# Altium footprint library Connector_PinHeader_2.54mm.PcbLib: 278 footprints (part 13 of 18) (continued)
## PinHeader_2x15_P2.54mm_Horizontal [mm] (continued)
F.CrtYd:
  lines w0.05: -1.8,-37.35 -1.8,1.8 13.1,1.8 13.1,-37.35 -1.8,-37.35
F.Fab:
  lines w0.1: 4.04,-35.88 -0.32,-35.88 -0.32,-35.24 4.04,-35.24 ; 4.04,-33.34 -0.32,-33.34 -0.32,-32.7 4.04,-32.7 ; 4.04,-30.8 -0.32,-30.8 -0.32,-30.16 4.04,-30.16 ; 4.04,-28.26 -0.32,-28.26 -0.32,-27.62 4.04,-27.62 ; 4.04,-25.72 -0.32,-25.72 -0.32,-25.08 4.04,-25.08 ; 4.04,-23.18 -0.32,-23.18 -0.32,-22.54 4.04,-22.54 ; 4.04,-20.64 -0.32,-20.64 -0.32,-20 4.04,-20 ; 4.04,-18.1 -0.32,-18.1 -0.32,-17.46 4.04,-17.46 ; 4.04,-15.56 -0.32,-15.56 -0.32,-14.92 4.04,-14.92 ; 4.04,-13.02 -0.32,-13.02 -0.32,-12.38 4.04,-12.38 ; 4.04,-10.48 -0.32,-10.48 -0.32,-9.84 4.04,-9.84 ; 4.04,-7.94 -0.32,-7.94 -0.32,-7.3 4.04,-7.3 ; 4.04,-5.4 -0.32,-5.4 -0.32,-4.76 4.04,-4.76 ; 4.04,-2.86 -0.32,-2.86 -0.32,-2.22 4.04,-2.22 ; 4.04,-0.32 -0.32,-0.32 -0.32,0.32 4.04,0.32 ; 6.58,-35.88 12.58,-35.88 12.58,-35.24 6.58,-35.24 ; 6.58,-33.34 12.58,-33.34 12.58,-32.7 6.58,-32.7 ; 6.58,-30.8 12.58,-30.8 12.58,-30.16 6.58,-30.16 ; 6.58,-28.26 12.58,-28.26 12.58,-27.62 6.58,-27.62 ; 6.58,-25.72 12.58,-25.72 12.58,-25.08 6.58,-25.08 ; 6.58,-23.18 12.58,-23.18 12.58,-22.54 6.58,-22.54 ; 6.58,-20.64 12.58,-20.64 12.58,-20 6.58,-20 ; 6.58,-18.1 12.58,-18.1 12.58,-17.46 6.58,-17.46 ; 6.58,-15.56 12.58,-15.56 12.58,-14.92 6.58,-14.92 ; 6.58,-13.02 12.58,-13.02 12.58,-12.38 6.58,-12.38 ; 6.58,-10.48 12.58,-10.48 12.58,-9.84 6.58,-9.84 ; 6.58,-7.94 12.58,-7.94 12.58,-7.3 6.58,-7.3 ; 6.58,-5.4 12.58,-5.4 12.58,-4.76 6.58,-4.76 ; 6.58,-2.86 12.58,-2.86 12.58,-2.22 6.58,-2.22 ; 6.58,-0.32 12.58,-0.32 12.58,0.32 6.58,0.32 ; 4.04,-36.83 4.04,0.635 4.675,1.27 6.58,1.27 6.58,-36.83 4.04,-36.83
  text "'.Designator'" at 6.15,-21.827 h1

## PinHeader_2x15_P2.54mm_Vertical [mm]
pads (30):
  rect 1.7x1.7 hole 1: 1(0,0)
  rrect100% 1.7x1.7 hole 1: 2(2.54,0) 3(0,-2.54) 4(2.54,-2.54) 5(0,-5.08) 6(2.54,-5.08) 7(0,-7.62) 8(2.54,-7.62) 9(0,-10.16) 10(2.54,-10.16) 11(0,-12.7) 12(2.54,-12.7) 13(0,-15.24) 14(2.54,-15.24) 15(0,-17.78) 16(2.54,-17.78) 17(0,-20.32) 18(2.54,-20.32) 19(0,-22.86) 20(2.54,-22.86) 21(0,-25.4) 22(2.54,-25.4) 23(0,-27.94) 24(2.54,-27.94) 25(0,-30.48) 26(2.54,-30.48) 27(0,-33.02) 28(2.54,-33.02) 29(0,-35.56) 30(2.54,-35.56)
F.SilkS:
  lines w0.12: -1.33,0 -1.33,1.33 0,1.33 ; -1.33,-36.89 3.87,-36.89 3.87,1.33 1.27,1.33 1.27,-1.27 -1.33,-1.27 -1.33,-36.89
F.CrtYd:
  lines w0.05: -1.8,-37.35 4.35,-37.35 4.35,1.8 -1.8,1.8 -1.8,-37.35
F.Fab:
  lines w0.1: -1.27,-36.83 -1.27,0 0,1.27 3.81,1.27 3.81,-36.83 -1.27,-36.83
  text "'.Designator'" at 2.11,-21.827 h1

## PinHeader_2x15_P2.54mm_Vertical_SMD [mm]
pads (30):
  rect 3.15x1 smd: 1(-2.525,17.78) 2(2.525,17.78) 3(-2.525,15.24) 4(2.525,15.24) 5(-2.525,12.7) 6(2.525,12.7) 7(-2.525,10.16) 8(2.525,10.16) 9(-2.525,7.62) 10(2.525,7.62) 11(-2.525,5.08) 12(2.525,5.08) 13(-2.525,2.54) 14(2.525,2.54) 15(-2.525,0) 16(2.525,0) 17(-2.525,-2.54) 18(2.525,-2.54) 19(-2.525,-5.08) 20(2.525,-5.08) 21(-2.525,-7.62) 22(2.525,-7.62) 23(-2.525,-10.16) 24(2.525,-10.16) 25(-2.525,-12.7) 26(2.525,-12.7) 27(-2.525,-15.24) 28(2.525,-15.24) 29(-2.525,-17.78) 30(2.525,-17.78)
F.SilkS:
  lines w0.12: -4.04,18.54 -2.6,18.54 -2.6,19.11 2.6,19.11 2.6,18.54 ; -2.6,-18.54 -2.6,-19.11 2.6,-19.11 2.6,-18.54 ; -2.6,-17.02 -2.6,-16 ; -2.6,-14.48 -2.6,-13.46 ; -2.6,-11.94 -2.6,-10.92 ; -2.6,-9.4 -2.6,-8.38 ; -2.6,-6.86 -2.6,-5.84 ; -2.6,-4.32 -2.6,-3.3 ; -2.6,-1.78 -2.6,-0.76 ; -2.6,0.76 -2.6,1.78 ; -2.6,3.3 -2.6,4.32 ; -2.6,5.84 -2.6,6.86 ; -2.6,8.38 -2.6,9.4 ; -2.6,10.92 -2.6,11.94 ; -2.6,13.46 -2.6,14.48 ; -2.6,16 -2.6,17.02 ; 2.6,-17.02 2.6,-16 ; 2.6,-14.48 2.6,-13.46 ; 2.6,-11.94 2.6,-10.92 ; 2.6,-9.4 2.6,-8.38 ; 2.6,-6.86 2.6,-5.84 ; 2.6,-4.32 2.6,-3.3 ; 2.6,-1.78 2.6,-0.76 ; 2.6,0.76 2.6,1.78 ; 2.6,3.3 2.6,4.32 ; 2.6,5.84 2.6,6.86 ; 2.6,8.38 2.6,9.4 ; 2.6,10.92 2.6,11.94 ; 2.6,13.46 2.6,14.48 ; 2.6,16 2.6,17.02
F.CrtYd:
  lines w0.05: -5.9,-19.6 5.9,-19.6 5.9,19.6 -5.9,19.6 -5.9,-19.6
F.Fab:
  lines w0.1: -2.54,-18.1 -3.6,-18.1 -3.6,-17.46 -2.54,-17.46 ; -2.54,-15.56 -3.6,-15.56 -3.6,-14.92 -2.54,-14.92 ; -2.54,-13.02 -3.6,-13.02 -3.6,-12.38 -2.54,-12.38 ; -2.54,-10.48 -3.6,-10.48 -3.6,-9.84 -2.54,-9.84 ; -2.54,-7.94 -3.6,-7.94 -3.6,-7.3 -2.54,-7.3 ; -2.54,-5.4 -3.6,-5.4 -3.6,-4.76 -2.54,-4.76 ; -2.54,-2.86 -3.6,-2.86 -3.6,-2.22 -2.54,-2.22 ; -2.54,-0.32 -3.6,-0.32 -3.6,0.32 -2.54,0.32 ; -2.54,2.22 -3.6,2.22 -3.6,2.86 -2.54,2.86 ; -2.54,4.76 -3.6,4.76 -3.6,5.4 -2.54,5.4 ; -2.54,7.3 -3.6,7.3 -3.6,7.94 -2.54,7.94 ; -2.54,9.84 -3.6,9.84 -3.6,10.48 -2.54,10.48 ; -2.54,12.38 -3.6,12.38 -3.6,13.02 -2.54,13.02 ; -2.54,14.92 -3.6,14.92 -3.6,15.56 -2.54,15.56 ; -2.54,17.46 -3.6,17.46 -3.6,18.1 -2.54,18.1 ; 2.54,-18.1 3.6,-18.1 3.6,-17.46 2.54,-17.46 ; 2.54,-15.56 3.6,-15.56 3.6,-14.92 2.54,-14.92 ; 2.54,-13.02 3.6,-13.02 3.6,-12.38 2.54,-12.38 ; 2.54,-10.48 3.6,-10.48 3.6,-9.84 2.54,-9.84 ; 2.54,-7.94 3.6,-7.94 3.6,-7.3 2.54,-7.3 ; 2.54,-5.4 3.6,-5.4 3.6,-4.76 2.54,-4.76 ; 2.54,-2.86 3.6,-2.86 3.6,-2.22 2.54,-2.22 ; 2.54,-0.32 3.6,-0.32 3.6,0.32 2.54,0.32 ; 2.54,2.22 3.6,2.22 3.6,2.86 2.54,2.86 ; 2.54,4.76 3.6,4.76 3.6,5.4 2.54,5.4 ; 2.54,7.3 3.6,7.3 3.6,7.94 2.54,7.94 ; 2.54,9.84 3.6,9.84 3.6,10.48 2.54,10.48 ; 2.54,12.38 3.6,12.38 3.6,13.02 2.54,13.02 ; 2.54,14.92 3.6,14.92 3.6,15.56 2.54,15.56 ; 2.54,17.46 3.6,17.46 3.6,18.1 2.54,18.1 ; -2.54,18.1 -2.54,-19.05 2.54,-19.05 2.54,19.05 -1.59,19.05 -2.54,18.1
  text "'.Designator'" at 0.84,-4.047 h1

## PinHeader_2x16_P2.54mm_Horizontal [mm]
pads (32):
  rect 1.7x1.7 hole 1: 1(0,0)
  rrect100% 1.7x1.7 hole 1: 2(2.54,0) 3(0,-2.54) 4(2.54,-2.54) 5(0,-5.08) 6(2.54,-5.08) 7(0,-7.62) 8(2.54,-7.62) 9(0,-10.16) 10(2.54,-10.16) 11(0,-12.7) 12(2.54,-12.7) 13(0,-15.24) 14(2.54,-15.24) 15(0,-17.78) 16(2.54,-17.78) 17(0,-20.32) 18(2.54,-20.32) 19(0,-22.86) 20(2.54,-22.86) 21(0,-25.4) 22(2.54,-25.4) 23(0,-27.94) 24(2.54,-27.94) 25(0,-30.48) 26(2.54,-30.48) 27(0,-33.02) 28(2.54,-33.02) 29(0,-35.56) 30(2.54,-35.56) 31(0,-38.1) 32(2.54,-38.1)
F.SilkS:
  lines w0.12: -1.27,0 -1.27,1.27 0,1.27 ; 1.043,-38.48 1.497,-38.48 ; 1.043,-37.72 1.497,-37.72 ; 1.043,-35.94 1.497,-35.94 ; 1.043,-35.18 1.497,-35.18 ; 1.043,-33.4 1.497,-33.4 ; 1.043,-32.64 1.497,-32.64 ; 1.043,-30.86 1.497,-30.86 ; 1.043,-30.1 1.497,-30.1 ; 1.043,-28.32 1.497,-28.32 ; 1.043,-27.56 1.497,-27.56 ; 1.043,-25.78 1.497,-25.78 ; 1.043,-25.02 1.497,-25.02 ; 1.043,-23.24 1.497,-23.24 ; 1.043,-22.48 1.497,-22.48 ; 1.043,-20.7 1.497,-20.7 ; 1.043,-19.94 1.497,-19.94 ; 1.043,-18.16 1.497,-18.16 ; 1.043,-17.4 1.497,-17.4 ; 1.043,-15.62 1.497,-15.62 ; 1.043,-14.86 1.497,-14.86 ; 1.043,-13.08 1.497,-13.08 ; 1.043,-12.32 1.497,-12.32 ; 1.043,-10.54 1.497,-10.54 ; 1.043,-9.78 1.497,-9.78 ; 1.043,-8 1.497,-8 ; 1.043,-7.24 1.497,-7.24 ; 1.043,-5.46 1.497,-5.46 ; 1.043,-4.7 1.497,-4.7 ; 1.043,-2.92 1.497,-2.92 ; 1.043,-2.16 1.497,-2.16 ; 1.11,-0.38 1.497,-0.38 ; 1.11,0.38 1.497,0.38 ; 3.583,-38.48 3.98,-38.48 ; 3.583,-37.72 3.98,-37.72 ; 3.583,-35.94 3.98,-35.94 ; 3.583,-35.18 3.98,-35.18 ; 3.583,-33.4 3.98,-33.4 ; 3.583,-32.64 3.98,-32.64 ; 3.583,-30.86 3.98,-30.86 ; 3.583,-30.1 3.98,-30.1 ; 3.583,-28.32 3.98,-28.32 ; 3.583,-27.56 3.98,-27.56 ; 3.583,-25.78 3.98,-25.78 ; 3.583,-25.02 3.98,-25.02 ; 3.583,-23.24 3.98,-23.24 ; 3.583,-22.48 3.98,-22.48 ; 3.583,-20.7 3.98,-20.7 ; 3.583,-19.94 3.98,-19.94 ; 3.583,-18.16 3.98,-18.16 ; 3.583,-17.4 3.98,-17.4 ; 3.583,-15.62 3.98,-15.62 ; 3.583,-14.86 3.98,-14.86 ; 3.583,-13.08 3.98,-13.08 ; 3.583,-12.32 3.98,-12.32 ; 3.583,-10.54 3.98,-10.54 ; 3.583,-9.78 3.98,-9.78 ; 3.583,-8 3.98,-8 ; 3.583,-7.24 3.98,-7.24 ; 3.583,-5.46 3.98,-5.46 ; 3.583,-4.7 3.98,-4.7 ; 3.583,-2.92 3.98,-2.92 ; 3.583,-2.16 3.98,-2.16 ; 3.583,-0.38 3.98,-0.38 ; 3.583,0.38 3.98,0.38 ; 3.98,-36.83 6.64,-36.83 ; 3.98,-34.29 6.64,-34.29 ; 3.98,-31.75 6.64,-31.75 ; 3.98,-29.21 6.64,-29.21 ; 3.98,-26.67 6.64,-26.67 ; 3.98,-24.13 6.64,-24.13 ; 3.98,-21.59 6.64,-21.59 ; 3.98,-19.05 6.64,-19.05 ; 3.98,-16.51 6.64,-16.51 ; 3.98,-13.97 6.64,-13.97 ; 3.98,-11.43 6.64,-11.43 ; 3.98,-8.89 6.64,-8.89 ; 3.98,-6.35 6.64,-6.35 ; 3.98,-3.81 6.64,-3.81 ; 3.98,-1.27 6.64,-1.27 ; 6.64,-38.48 12.64,-38.48 12.64,-37.72 6.64,-37.72 ; 6.64,-35.94 12.64,-35.94 12.64,-35.18 6.64,-35.18 ; 6.64,-33.4 12.64,-33.4 12.64,-32.64 6.64,-32.64 ; 6.64,-30.86 12.64,-30.86 12.64,-30.1 6.64,-30.1 ; 6.64,-28.32 12.64,-28.32 12.64,-27.56 6.64,-27.56 ; 6.64,-25.78 12.64,-25.78 12.64,-25.02 6.64,-25.02 ; 6.64,-23.24 12.64,-23.24 12.64,-22.48 6.64,-22.48 ; 6.64,-20.7 12.64,-20.7 12.64,-19.94 6.64,-19.94 ; 6.64,-18.16 12.64,-18.16 12.64,-17.4 6.64,-17.4 ; 6.64,-15.62 12.64,-15.62 12.64,-14.86 6.64,-14.86 ; 6.64,-13.08 12.64,-13.08 12.64,-12.32 6.64,-12.32 ; 6.64,-10.54 12.64,-10.54 12.64,-9.78 6.64,-9.78 ; 6.64,-8 12.64,-8 12.64,-7.24 6.64,-7.24 ; 6.64,-5.46 12.64,-5.46 12.64,-4.7 6.64,-4.7 ; 6.64,-2.92 12.64,-2.92 12.64,-2.16 6.64,-2.16 ; 6.64,-0.38 12.64,-0.38 12.64,0.38 6.64,0.38 ; 6.64,-0.28 12.64,-0.28 ; 6.64,-0.16 12.64,-0.16 ; 6.64,-0.04 12.64,-0.04 ; 6.64,0.08 12.64,0.08 ; 6.64,0.2 12.64,0.2 ; 6.64,0.32 12.64,0.32 ; 3.98,-39.43 3.98,1.33 6.64,1.33 6.64,-39.43 3.98,-39.43
F.CrtYd:
  lines w0.05: -1.8,-39.9 -1.8,1.8 13.1,1.8 13.1,-39.9 -1.8,-39.9
F.Fab:
  lines w0.1: 4.04,-38.42 -0.32,-38.42 -0.32,-37.78 4.04,-37.78 ; 4.04,-35.88 -0.32,-35.88 -0.32,-35.24 4.04,-35.24 ; 4.04,-33.34 -0.32,-33.34 -0.32,-32.7 4.04,-32.7 ; 4.04,-30.8 -0.32,-30.8 -0.32,-30.16 4.04,-30.16 ; 4.04,-28.26 -0.32,-28.26 -0.32,-27.62 4.04,-27.62 ; 4.04,-25.72 -0.32,-25.72 -0.32,-25.08 4.04,-25.08 ; 4.04,-23.18 -0.32,-23.18 -0.32,-22.54 4.04,-22.54 ; 4.04,-20.64 -0.32,-20.64 -0.32,-20 4.04,-20 ; 4.04,-18.1 -0.32,-18.1 -0.32,-17.46 4.04,-17.46 ; 4.04,-15.56 -0.32,-15.56 -0.32,-14.92 4.04,-14.92 ; 4.04,-13.02 -0.32,-13.02 -0.32,-12.38 4.04,-12.38 ; 4.04,-10.48 -0.32,-10.48 -0.32,-9.84 4.04,-9.84 ; 4.04,-7.94 -0.32,-7.94 -0.32,-7.3 4.04,-7.3 ; 4.04,-5.4 -0.32,-5.4 -0.32,-4.76 4.04,-4.76 ; 4.04,-2.86 -0.32,-2.86 -0.32,-2.22 4.04,-2.22 ; 4.04,-0.32 -0.32,-0.32 -0.32,0.32 4.04,0.32 ; 6.58,-38.42 12.58,-38.42 12.58,-37.78 6.58,-37.78 ; 6.58,-35.88 12.58,-35.88 12.58,-35.24 6.58,-35.24 ; 6.58,-33.34 12.58,-33.34 12.58,-32.7 6.58,-32.7 ; 6.58,-30.8 12.58,-30.8 12.58,-30.16 6.58,-30.16 ; 6.58,-28.26 12.58,-28.26 12.58,-27.62 6.58,-27.62 ; 6.58,-25.72 12.58,-25.72 12.58,-25.08 6.58,-25.08 ; 6.58,-23.18 12.58,-23.18 12.58,-22.54 6.58,-22.54 ; 6.58,-20.64 12.58,-20.64 12.58,-20 6.58,-20 ; 6.58,-18.1 12.58,-18.1 12.58,-17.46 6.58,-17.46 ; 6.58,-15.56 12.58,-15.56 12.58,-14.92 6.58,-14.92 ; 6.58,-13.02 12.58,-13.02 12.58,-12.38 6.58,-12.38 ; 6.58,-10.48 12.58,-10.48 12.58,-9.84 6.58,-9.84 ; 6.58,-7.94 12.58,-7.94 12.58,-7.3 6.58,-7.3 ; 6.58,-5.4 12.58,-5.4 12.58,-4.76 6.58,-4.76 ; 6.58,-2.86 12.58,-2.86 12.58,-2.22 6.58,-2.22 ; 6.58,-0.32 12.58,-0.32 12.58,0.32 6.58,0.32 ; 4.04,-39.37 6.58,-39.37 6.58,1.27 4.675,1.27 4.04,0.635 4.04,-39.37
  text "'.Designator'" at 6.15,-23.097 h1

## PinHeader_2x16_P2.54mm_Vertical [mm]
pads (32):
  rect 1.7x1.7 hole 1: 1(0,0)
  rrect100% 1.7x1.7 hole 1: 2(2.54,0) 3(0,-2.54) 4(2.54,-2.54) 5(0,-5.08) 6(2.54,-5.08) 7(0,-7.62) 8(2.54,-7.62) 9(0,-10.16) 10(2.54,-10.16) 11(0,-12.7) 12(2.54,-12.7) 13(0,-15.24) 14(2.54,-15.24) 15(0,-17.78) 16(2.54,-17.78) 17(0,-20.32) 18(2.54,-20.32) 19(0,-22.86) 20(2.54,-22.86) 21(0,-25.4) 22(2.54,-25.4) 23(0,-27.94) 24(2.54,-27.94) 25(0,-30.48) 26(2.54,-30.48) 27(0,-33.02) 28(2.54,-33.02) 29(0,-35.56) 30(2.54,-35.56) 31(0,-38.1) 32(2.54,-38.1)
F.SilkS:
  lines w0.12: -1.33,0 -1.33,1.33 0,1.33 ; -1.33,-39.43 3.87,-39.43 3.87,1.33 1.27,1.33 1.27,-1.27 -1.33,-1.27 -1.33,-39.43
F.CrtYd:
  lines w0.05: -1.8,-39.9 4.35,-39.9 4.35,1.8 -1.8,1.8 -1.8,-39.9
F.Fab:
  lines w0.1: -1.27,-39.37 -1.27,0 0,1.27 3.81,1.27 3.81,-39.37 -1.27,-39.37
  text "'.Designator'" at 2.11,-23.097 h1

## PinHeader_2x16_P2.54mm_Vertical_SMD [mm]
pads (32):
  rect 3.15x1 smd: 1(-2.525,19.05) 2(2.525,19.05) 3(-2.525,16.51) 4(2.525,16.51) 5(-2.525,13.97) 6(2.525,13.97) 7(-2.525,11.43) 8(2.525,11.43) 9(-2.525,8.89) 10(2.525,8.89) 11(-2.525,6.35) 12(2.525,6.35) 13(-2.525,3.81) 14(2.525,3.81) 15(-2.525,1.27) 16(2.525,1.27) 17(-2.525,-1.27) 18(2.525,-1.27) 19(-2.525,-3.81) 20(2.525,-3.81) 21(-2.525,-6.35) 22(2.525,-6.35) 23(-2.525,-8.89) 24(2.525,-8.89) 25(-2.525,-11.43) 26(2.525,-11.43) 27(-2.525,-13.97) 28(2.525,-13.97) 29(-2.525,-16.51) 30(2.525,-16.51) 31(-2.525,-19.05) 32(2.525,-19.05)
F.SilkS:
  lines w0.12: -4.04,19.81 -2.6,19.81 -2.6,20.38 2.6,20.38 2.6,19.81 ; -2.6,-19.81 -2.6,-20.38 2.6,-20.38 2.6,-19.81 ; -2.6,-18.29 -2.6,-17.27 ; -2.6,-15.75 -2.6,-14.73 ; -2.6,-13.21 -2.6,-12.19 ; -2.6,-10.67 -2.6,-9.65 ; -2.6,-8.13 -2.6,-7.11 ; -2.6,-5.59 -2.6,-4.57 ; -2.6,-3.05 -2.6,-2.03 ; -2.6,-0.51 -2.6,0.51 ; -2.6,2.03 -2.6,3.05 ; -2.6,4.57 -2.6,5.59 ; -2.6,7.11 -2.6,8.13 ; -2.6,9.65 -2.6,10.67 ; -2.6,12.19 -2.6,13.21 ; -2.6,14.73 -2.6,15.75 ; -2.6,17.27 -2.6,18.29 ; 2.6,-18.29 2.6,-17.27 ; 2.6,-15.75 2.6,-14.73 ; 2.6,-13.21 2.6,-12.19 ; 2.6,-10.67 2.6,-9.65 ; 2.6,-8.13 2.6,-7.11 ; 2.6,-5.59 2.6,-4.57 ; 2.6,-3.05 2.6,-2.03 ; 2.6,-0.51 2.6,0.51 ; 2.6,2.03 2.6,3.05 ; 2.6,4.57 2.6,5.59 ; 2.6,7.11 2.6,8.13 ; 2.6,9.65 2.6,10.67 ; 2.6,12.19 2.6,13.21 ; 2.6,14.73 2.6,15.75 ; 2.6,17.27 2.6,18.29
F.CrtYd:
  lines w0.05: -5.9,-20.85 5.9,-20.85 5.9,20.85 -5.9,20.85 -5.9,-20.85
F.Fab:
  lines w0.1: -2.54,-19.37 -3.6,-19.37 -3.6,-18.73 -2.54,-18.73 ; -2.54,-16.83 -3.6,-16.83 -3.6,-16.19 -2.54,-16.19 ; -2.54,-14.29 -3.6,-14.29 -3.6,-13.65 -2.54,-13.65 ; -2.54,-11.75 -3.6,-11.75 -3.6,-11.11 -2.54,-11.11 ; -2.54,-9.21 -3.6,-9.21 -3.6,-8.57 -2.54,-8.57 ; -2.54,-6.67 -3.6,-6.67 -3.6,-6.03 -2.54,-6.03 ; -2.54,-4.13 -3.6,-4.13 -3.6,-3.49 -2.54,-3.49 ; -2.54,-1.59 -3.6,-1.59 -3.6,-0.95 -2.54,-0.95 ; -2.54,0.95 -3.6,0.95 -3.6,1.59 -2.54,1.59 ; -2.54,3.49 -3.6,3.49 -3.6,4.13 -2.54,4.13 ; -2.54,6.03 -3.6,6.03 -3.6,6.67 -2.54,6.67 ; -2.54,8.57 -3.6,8.57 -3.6,9.21 -2.54,9.21 ; -2.54,11.11 -3.6,11.11 -3.6,11.75 -2.54,11.75 ; -2.54,13.65 -3.6,13.65 -3.6,14.29 -2.54,14.29 ; -2.54,16.19 -3.6,16.19 -3.6,16.83 -2.54,16.83 ; -2.54,18.73 -3.6,18.73 -3.6,19.37 -2.54,19.37 ; 2.54,-19.37 3.6,-19.37 3.6,-18.73 2.54,-18.73 ; 2.54,-16.83 3.6,-16.83 3.6,-16.19 2.54,-16.19 ; 2.54,-14.29 3.6,-14.29 3.6,-13.65 2.54,-13.65 ; 2.54,-11.75 3.6,-11.75 3.6,-11.11 2.54,-11.11 ; 2.54,-9.21 3.6,-9.21 3.6,-8.57 2.54,-8.57 ; 2.54,-6.67 3.6,-6.67 3.6,-6.03 2.54,-6.03 ; 2.54,-4.13 3.6,-4.13 3.6,-3.49 2.54,-3.49 ; 2.54,-1.59 3.6,-1.59 3.6,-0.95 2.54,-0.95 ; 2.54,0.95 3.6,0.95 3.6,1.59 2.54,1.59 ; 2.54,3.49 3.6,3.49 3.6,4.13 2.54,4.13 ; 2.54,6.03 3.6,6.03 3.6,6.67 2.54,6.67 ; 2.54,8.57 3.6,8.57 3.6,9.21 2.54,9.21 ; 2.54,11.11 3.6,11.11 3.6,11.75 2.54,11.75 ; 2.54,13.65 3.6,13.65 3.6,14.29 2.54,14.29 ; 2.54,16.19 3.6,16.19 3.6,16.83 2.54,16.83 ; 2.54,18.73 3.6,18.73 3.6,19.37 2.54,19.37 ; -2.54,19.37 -2.54,-20.32 2.54,-20.32 2.54,20.32 -1.59,20.32 -2.54,19.37
  text "'.Designator'" at 0.84,-4.047 h1

## PinHeader_2x17_P2.54mm_Horizontal [mm]
pads (34):
  rect 1.7x1.7 hole 1: 1(0,0)
  rrect100% 1.7x1.7 hole 1: 2(2.54,0) 3(0,-2.54) 4(2.54,-2.54) 5(0,-5.08) 6(2.54,-5.08) 7(0,-7.62) 8(2.54,-7.62) 9(0,-10.16) 10(2.54,-10.16) 11(0,-12.7) 12(2.54,-12.7) 13(0,-15.24) 14(2.54,-15.24) 15(0,-17.78) 16(2.54,-17.78) 17(0,-20.32) 18(2.54,-20.32) 19(0,-22.86) 20(2.54,-22.86) 21(0,-25.4) 22(2.54,-25.4) 23(0,-27.94) 24(2.54,-27.94) 25(0,-30.48) 26(2.54,-30.48) 27(0,-33.02) 28(2.54,-33.02) 29(0,-35.56) 30(2.54,-35.56) 31(0,-38.1) 32(2.54,-38.1) 33(0,-40.64) 34(2.54,-40.64)
F.SilkS:
  lines w0.12: -1.27,0 -1.27,1.27 0,1.27 ; 1.043,-41.02 1.497,-41.02 ; 1.043,-40.26 1.497,-40.26 ; 1.043,-38.48 1.497,-38.48 ; 1.043,-37.72 1.497,-37.72 ; 1.043,-35.94 1.497,-35.94 ; 1.043,-35.18 1.497,-35.18 ; 1.043,-33.4 1.497,-33.4 ; 1.043,-32.64 1.497,-32.64 ; 1.043,-30.86 1.497,-30.86 ; 1.043,-30.1 1.497,-30.1 ; 1.043,-28.32 1.497,-28.32 ; 1.043,-27.56 1.497,-27.56 ; 1.043,-25.78 1.497,-25.78 ; 1.043,-25.02 1.497,-25.02 ; 1.043,-23.24 1.497,-23.24 ; 1.043,-22.48 1.497,-22.48 ; 1.043,-20.7 1.497,-20.7 ; 1.043,-19.94 1.497,-19.94 ; 1.043,-18.16 1.497,-18.16 ; 1.043,-17.4 1.497,-17.4 ; 1.043,-15.62 1.497,-15.62 ; 1.043,-14.86 1.497,-14.86 ; 1.043,-13.08 1.497,-13.08 ; 1.043,-12.32 1.497,-12.32 ; 1.043,-10.54 1.497,-10.54 ; 1.043,-9.78 1.497,-9.78 ; 1.043,-8 1.497,-8 ; 1.043,-7.24 1.497,-7.24 ; 1.043,-5.46 1.497,-5.46 ; 1.043,-4.7 1.497,-4.7 ; 1.043,-2.92 1.497,-2.92 ; 1.043,-2.16 1.497,-2.16 ; 1.11,-0.38 1.497,-0.38 ; 1.11,0.38 1.497,0.38 ; 3.583,-41.02 3.98,-41.02 ; 3.583,-40.26 3.98,-40.26 ; 3.583,-38.48 3.98,-38.48 ; 3.583,-37.72 3.98,-37.72 ; 3.583,-35.94 3.98,-35.94 ; 3.583,-35.18 3.98,-35.18 ; 3.583,-33.4 3.98,-33.4 ; 3.583,-32.64 3.98,-32.64 ; 3.583,-30.86 3.98,-30.86 ; 3.583,-30.1 3.98,-30.1 ; 3.583,-28.32 3.98,-28.32 ; 3.583,-27.56 3.98,-27.56 ; 3.583,-25.78 3.98,-25.78 ; 3.583,-25.02 3.98,-25.02 ; 3.583,-23.24 3.98,-23.24 ; 3.583,-22.48 3.98,-22.48 ; 3.583,-20.7 3.98,-20.7 ; 3.583,-19.94 3.98,-19.94 ; 3.583,-18.16 3.98,-18.16 ; 3.583,-17.4 3.98,-17.4 ; 3.583,-15.62 3.98,-15.62 ; 3.583,-14.86 3.98,-14.86 ; 3.583,-13.08 3.98,-13.08 ; 3.583,-12.32 3.98,-12.32 ; 3.583,-10.54 3.98,-10.54 ; 3.583,-9.78 3.98,-9.78 ; 3.583,-8 3.98,-8 ; 3.583,-7.24 3.98,-7.24 ; 3.583,-5.46 3.98,-5.46 ; 3.583,-4.7 3.98,-4.7 ; 3.583,-2.92 3.98,-2.92 ; 3.583,-2.16 3.98,-2.16 ; 3.583,-0.38 3.98,-0.38 ; 3.583,0.38 3.98,0.38 ; 3.98,-39.37 6.64,-39.37 ; 3.98,-36.83 6.64,-36.83 ; 3.98,-34.29 6.64,-34.29 ; 3.98,-31.75 6.64,-31.75 ; 3.98,-29.21 6.64,-29.21 ; 3.98,-26.67 6.64,-26.67 ; 3.98,-24.13 6.64,-24.13 ; 3.98,-21.59 6.64,-21.59 ; 3.98,-19.05 6.64,-19.05 ; 3.98,-16.51 6.64,-16.51 ; 3.98,-13.97 6.64,-13.97 ; 3.98,-11.43 6.64,-11.43 ; 3.98,-8.89 6.64,-8.89 ; 3.98,-6.35 6.64,-6.35 ; 3.98,-3.81 6.64,-3.81 ; 3.98,-1.27 6.64,-1.27 ; 6.64,-41.02 12.64,-41.02 12.64,-40.26 6.64,-40.26 ; 6.64,-38.48 12.64,-38.48 12.64,-37.72 6.64,-37.72 ; 6.64,-35.94 12.64,-35.94 12.64,-35.18 6.64,-35.18 ; 6.64,-33.4 12.64,-33.4 12.64,-32.64 6.64,-32.64 ; 6.64,-30.86 12.64,-30.86 12.64,-30.1 6.64,-30.1 ; 6.64,-28.32 12.64,-28.32 12.64,-27.56 6.64,-27.56 ; 6.64,-25.78 12.64,-25.78 12.64,-25.02 6.64,-25.02 ; 6.64,-23.24 12.64,-23.24 12.64,-22.48 6.64,-22.48 ; 6.64,-20.7 12.64,-20.7 12.64,-19.94 6.64,-19.94 ; 6.64,-18.16 12.64,-18.16 12.64,-17.4 6.64,-17.4 ; 6.64,-15.62 12.64,-15.62 12.64,-14.86 6.64,-14.86 ; 6.64,-13.08 12.64,-13.08 12.64,-12.32 6.64,-12.32 ; 6.64,-10.54 12.64,-10.54 12.64,-9.78 6.64,-9.78 ; 6.64,-8 12.64,-8 12.64,-7.24 6.64,-7.24 ; 6.64,-5.46 12.64,-5.46 12.64,-4.7 6.64,-4.7 ; 6.64,-2.92 12.64,-2.92 12.64,-2.16 6.64,-2.16 ; 6.64,-0.38 12.64,-0.38 12.64,0.38 6.64,0.38 ; 6.64,-0.28 12.64,-0.28 ; 6.64,-0.16 12.64,-0.16 ; 6.64,-0.04 12.64,-0.04 ; 6.64,0.08 12.64,0.08 ; 6.64,0.2 12.64,0.2 ; 6.64,0.32 12.64,0.32 ; 3.98,-41.97 6.64,-41.97 6.64,1.33 3.98,1.33 3.98,-41.97
F.CrtYd:
  lines w0.05: -1.8,-42.45 13.1,-42.45 13.1,1.8 -1.8,1.8 -1.8,-42.45
F.Fab:
  lines w0.1: 4.04,-40.96 -0.32,-40.96 -0.32,-40.32 4.04,-40.32 ; 4.04,-38.42 -0.32,-38.42 -0.32,-37.78 4.04,-37.78 ; 4.04,-35.88 -0.32,-35.88 -0.32,-35.24 4.04,-35.24 ; 4.04,-33.34 -0.32,-33.34 -0.32,-32.7 4.04,-32.7 ; 4.04,-30.8 -0.32,-30.8 -0.32,-30.16 4.04,-30.16 ; 4.04,-28.26 -0.32,-28.26 -0.32,-27.62 4.04,-27.62 ; 4.04,-25.72 -0.32,-25.72 -0.32,-25.08 4.04,-25.08 ; 4.04,-23.18 -0.32,-23.18 -0.32,-22.54 4.04,-22.54 ; 4.04,-20.64 -0.32,-20.64 -0.32,-20 4.04,-20 ; 4.04,-18.1 -0.32,-18.1 -0.32,-17.46 4.04,-17.46 ; 4.04,-15.56 -0.32,-15.56 -0.32,-14.92 4.04,-14.92 ; 4.04,-13.02 -0.32,-13.02 -0.32,-12.38 4.04,-12.38 ; 4.04,-10.48 -0.32,-10.48 -0.32,-9.84 4.04,-9.84 ; 4.04,-7.94 -0.32,-7.94 -0.32,-7.3 4.04,-7.3 ; 4.04,-5.4 -0.32,-5.4 -0.32,-4.76 4.04,-4.76 ; 4.04,-2.86 -0.32,-2.86 -0.32,-2.22 4.04,-2.22 ; 4.04,-0.32 -0.32,-0.32 -0.32,0.32 4.04,0.32 ; 6.58,-40.96 12.58,-40.96 12.58,-40.32 6.58,-40.32 ; 6.58,-38.42 12.58,-38.42 12.58,-37.78 6.58,-37.78 ; 6.58,-35.88 12.58,-35.88 12.58,-35.24 6.58,-35.24 ; 6.58,-33.34 12.58,-33.34 12.58,-32.7 6.58,-32.7 ; 6.58,-30.8 12.58,-30.8 12.58,-30.16 6.58,-30.16 ; 6.58,-28.26 12.58,-28.26 12.58,-27.62 6.58,-27.62 ; 6.58,-25.72 12.58,-25.72 12.58,-25.08 6.58,-25.08 ; 6.58,-23.18 12.58,-23.18 12.58,-22.54 6.58,-22.54 ; 6.58,-20.64 12.58,-20.64 12.58,-20 6.58,-20 ; 6.58,-18.1 12.58,-18.1 12.58,-17.46 6.58,-17.46 ; 6.58,-15.56 12.58,-15.56 12.58,-14.92 6.58,-14.92 ; 6.58,-13.02 12.58,-13.02 12.58,-12.38 6.58,-12.38 ; 6.58,-10.48 12.58,-10.48 12.58,-9.84 6.58,-9.84 ; 6.58,-7.94 12.58,-7.94 12.58,-7.3 6.58,-7.3 ; 6.58,-5.4 12.58,-5.4 12.58,-4.76 6.58,-4.76 ; 6.58,-2.86 12.58,-2.86 12.58,-2.22 6.58,-2.22 ; 6.58,-0.32 12.58,-0.32 12.58,0.32 6.58,0.32 ; 4.04,-41.91 6.58,-41.91 6.58,1.27 4.675,1.27 4.04,0.635 4.04,-41.91
  text "'.Designator'" at 6.15,-24.367 h1

## PinHeader_2x17_P2.54mm_Vertical [mm]
pads (34):
  rect 1.7x1.7 hole 1: 1(0,0)
  rrect100% 1.7x1.7 hole 1: 2(2.54,0) 3(0,-2.54) 4(2.54,-2.54) 5(0,-5.08) 6(2.54,-5.08) 7(0,-7.62) 8(2.54,-7.62) 9(0,-10.16) 10(2.54,-10.16) 11(0,-12.7) 12(2.54,-12.7) 13(0,-15.24) 14(2.54,-15.24) 15(0,-17.78) 16(2.54,-17.78) 17(0,-20.32) 18(2.54,-20.32) 19(0,-22.86) 20(2.54,-22.86) 21(0,-25.4) 22(2.54,-25.4) 23(0,-27.94) 24(2.54,-27.94) 25(0,-30.48) 26(2.54,-30.48) 27(0,-33.02) 28(2.54,-33.02) 29(0,-35.56) 30(2.54,-35.56) 31(0,-38.1) 32(2.54,-38.1) 33(0,-40.64) 34(2.54,-40.64)
F.SilkS:
  lines w0.12: -1.33,0 -1.33,1.33 0,1.33 ; -1.33,-41.97 -1.33,-1.27 1.27,-1.27 1.27,1.33 3.87,1.33 3.87,-41.97 -1.33,-41.97
F.CrtYd:
  lines w0.05: -1.8,-42.45 4.35,-42.45 4.35,1.8 -1.8,1.8 -1.8,-42.45
F.Fab:
  lines w0.1: -1.27,-41.91 3.81,-41.91 3.81,1.27 0,1.27 -1.27,0 -1.27,-41.91
  text "'.Designator'" at 2.11,-24.367 h1